# Altium footprint library NDLib.PCBLIB: 499 footprints (part 6 of 32)
Each footprint in its own frame and in the unit in brackets; x right, y up, seen from the top. Pads: shape width x height; smd on the part's side, far side on the other; paste and mask are expansions set on the pad; w line width, h text height; cw(c..) or ccw(c..) is an arc to the next point about the centre after c.
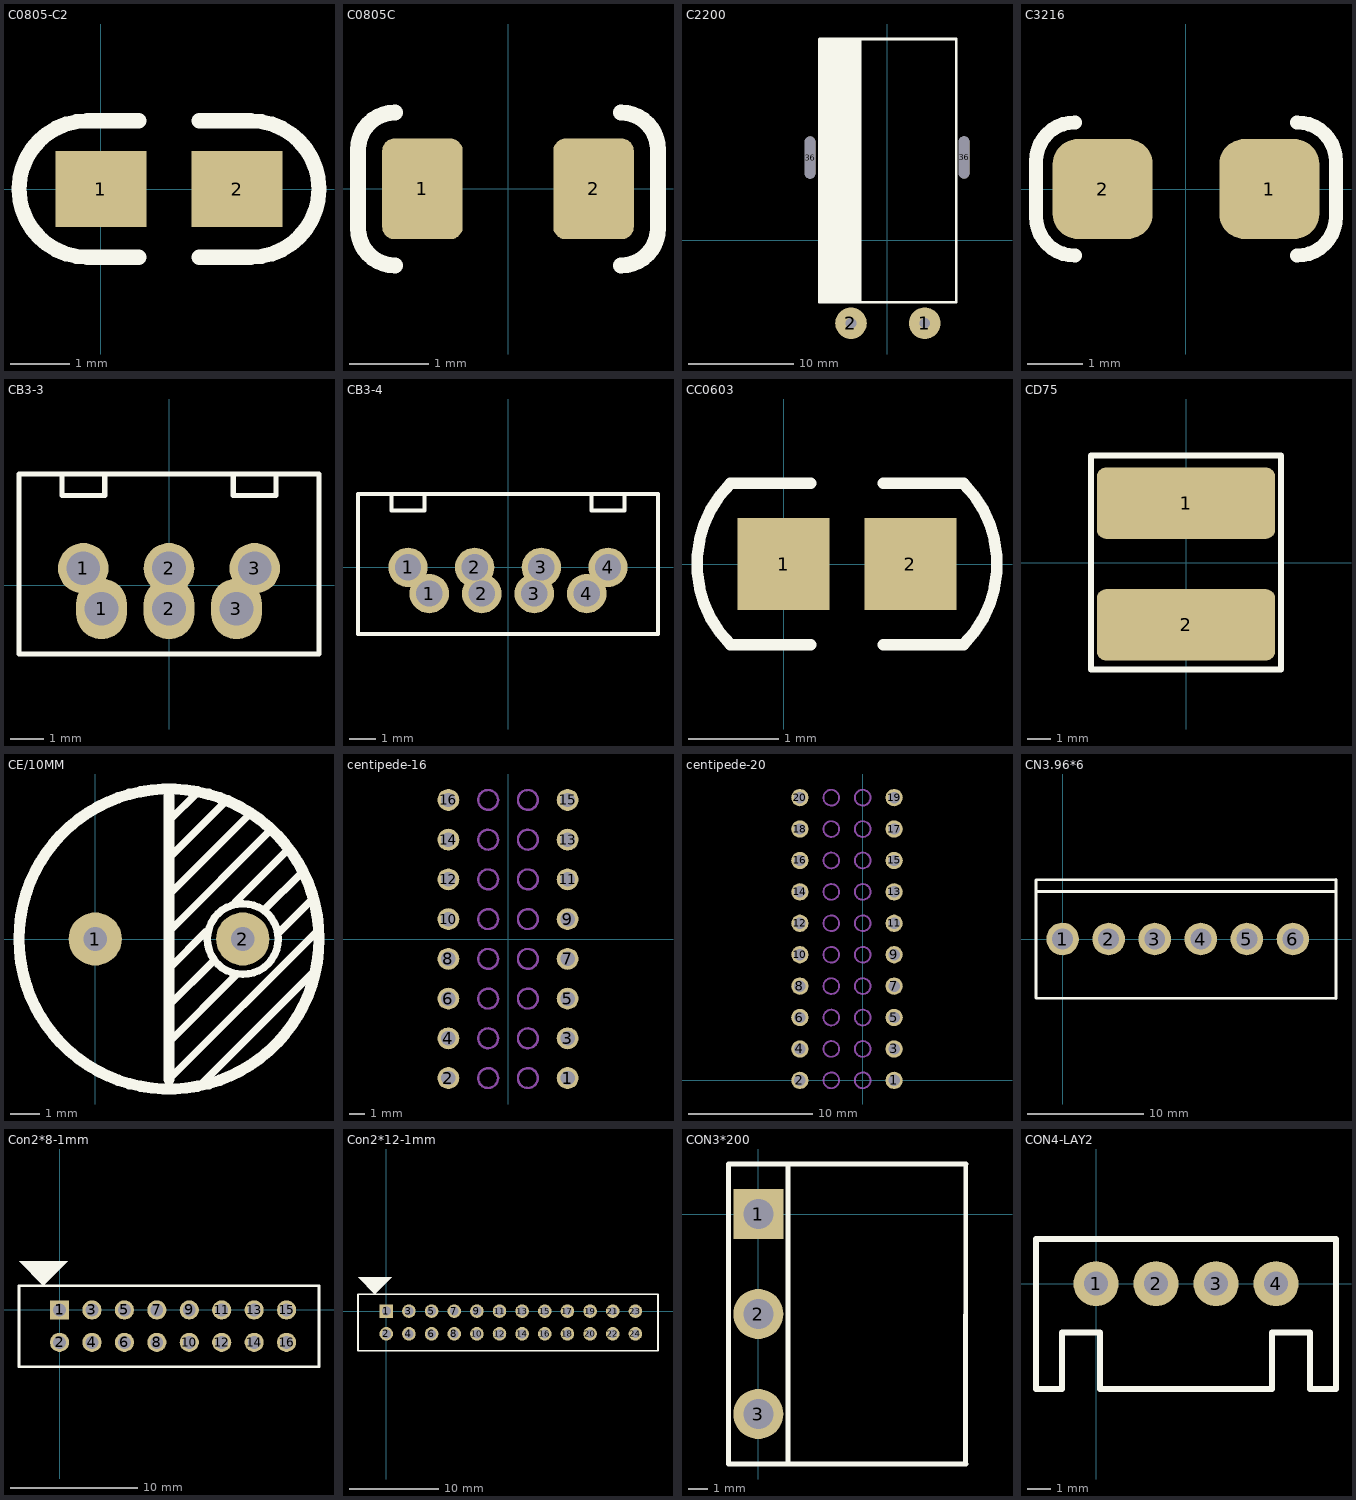
[diagram p5: the footprints below, top view; thin cyan lines are the x and y axes]

## C0805-C2 [mil]
height 78.74
pads (2):
  rect 60x50 smd: 1(0,0) 2(90,0)
TopOverlay:
  lines w10: 25,-45 -9,-45 cw(c-9,0) -9,45 25,45 ; 65,-45 99,-45 ccw(c99,0) 99,45 65,45

## C0805C [mil]
pads (2):
  rrect30% 40x50 smd: 1(-42.5,0) 2(42.5,0)
TopOverlay:
  lines w8: -74.5,-19.59 ccw(c-56.09,-19.59) -56.09,-38 ; -74.5,-18.59 -74.5,18.5 ; -74.5,19.5 cw(c-56.09,19.5) -56.09,37.91 ; 56.09,-38 ccw(c56.09,-19.59) 74.5,-19.59 ; 56.09,37.91 cw(c56.09,19.5) 74.5,19.5 ; 74.5,-18.59 74.5,18.5
3D body: height 30.39, standoff -0.39, extent -39.35,-24.61 39.39,24.61

## C2200 [mm]
height 10
pads (4):
  round 3 hole 1: 1(3.575,-7.875) 2(-3.425,-7.875)
  oval 1x4 hole 1 slot 4 at 90 deg: 36(-7.315,7.863) 36(7.315,7.875)
TopOverlay:
  region: -2.425,-5.877 -2.425,19.123 -6.425,19.123 -6.425,-5.877
  lines w0.254: -6.425,-5.875 -6.425,19.125 6.575,19.125 6.575,-5.875 -6.425,-5.875

## C3216 [mm]
pads (2):
  rrect50% 1.8x1.8 smd: 1(1.5,0) 2(-1.5,0)
TopOverlay:
  lines w0.254: -2,-1.2 cw(c-2,-0.5) -2.7,-0.5 -2.7,0.5 cw(c-2,0.5) -2,1.2 ; 2,-1.2 ccw(c2,-0.5) 2.7,-0.5 2.7,0.5 ccw(c2,0.5) 2,1.2

## CB3-3 [mm]
pads (6):
  round 1.5 hole 1: 1(-2.54,0.5) 2(0,0.5) 3(2.54,0.5)
  oval 1.5x1.8 hole 1: 1(-2,-0.7) 2(0,-0.7) 3(2,-0.7)
TopOverlay:
  lines w0.152: -3.175,3.294 -3.175,2.659 -1.905,2.659 -1.905,3.294 ; 1.905,3.294 1.905,2.659 3.175,2.659 3.175,3.294 ; -4.445,-2.04 4.445,-2.04 4.445,3.294 -4.445,3.294 -4.445,-2.04

## CB3-4 [mm]
pads (8):
  round 1.5 hole 1: 1(-3.81,0) 1(-3,-1) 2(-1.27,0) 2(-1,-1) 3(1,-1) 3(1.27,0) 4(3,-1) 4(3.81,0)
TopOverlay:
  lines w0.152: -4.445,2.794 -4.445,2.159 -3.175,2.159 -3.175,2.794 ; 3.175,2.794 3.175,2.159 4.445,2.159 4.445,2.794 ; -5.715,-2.54 -5.715,2.794 5.715,2.794 5.715,-2.54 -5.715,-2.54

## CC0603 [mil]
pads (2):
  rect 40x40 smd: 1(0,0) 2(55,0)
TopOverlay:
  lines w5: 11.81,-35 -23.19,-35 cw(c11.81,0) -23.19,35 11.81,35 ; 43.19,-35 78.19,-35 ccw(c43.19,0) 78.19,35 43.19,35

## CD75 [mm]
height 4
pads (2):
  rrect25% 7.5x3 smd: 1(0,2.5) 2(0,-2.625)
TopOverlay:
  lines w0.254: -4,-4.5 -4,4.5 4,4.5 4,-4.5 -4,-4.5

## CE/10MM [mm]
pads (2):
  round 1.8 hole 0.8: 1(0,0) 2(5,0)
TopOverlay:
  circle w0.254: c5,0 r1.2
  circle w0.381: c2.5,0 r5.08
  lines w0.254: 2.5,-4.75 7.5,0.25 ; 2.5,-3.5 4.75,-1.25 ; 2.5,-2.25 4,-0.75 ; 2.5,-1 3.75,0.25 ; 2.5,0.25 6,3.75 ; 2.5,1.5 5.25,4.25 ; 2.5,4 3.5,5 ; 2.625,2.875 4.5,4.75 ; 3.5,-5 7.5,-1 ; 4.75,1.25 6.5,3 ; 5.75,1 7,2.25 ; 6.25,0.25 7.25,1.25 ; 7.371,-1.589 7.4,-1.425
  lines w0.381: 2.5,-4.75 2.5,4.826
3D body: height 16.53, standoff -3.74, extent -2.551,-5 7.5,5.051

## centipede-16 [mil]
height 196.85
pads (16):
  round 55 hole 36: 1(150,-350) 2(-150,-350) 3(150,-250) 4(-150,-250) 5(150,-150) 6(-150,-150) 7(150,-50) 8(-150,-50) 9(150,50) 10(-150,50) 11(150,150) 12(-150,150) 13(150,250) 14(-150,250) 15(150,350) 16(-150,350)
Mechanical1:
  circle w6: c50,150 r25
  circle w6: c-50,150 r25
  circle w6: c-50,250 r25
  circle w6: c50,250 r25
  circle w6: c-50,350 r25
  circle w6: c50,350 r25
  circle w6: c50,50 r25
  circle w6: c-50,50 r25
  circle w6: c50,-50 r25
  circle w6: c-50,-50 r25
  circle w6: c50,-150 r25
  circle w6: c-50,-150 r25
  circle w6: c50,-250 r25
  circle w6: c-50,-250 r25
  circle w6: c-50,-350 r25
  circle w6: c50,-350 r25

## centipede-20 [mil]
height 196.85
pads (20):
  round 55 hole 36: 1(100,0) 2(-200,0) 3(100,100) 4(-200,100) 5(100,200) 6(-200,200) 7(100,300) 8(-200,300) 9(100,400) 10(-200,400) 11(100,500) 12(-200,500) 13(100,600) 14(-200,600) 15(100,700) 16(-200,700) 17(100,800) 18(-200,800) 19(100,900) 20(-200,900)
Mechanical1:
  circle w6: c0,500 r25
  circle w6: c-100,500 r25
  circle w6: c-100,600 r25
  circle w6: c0,600 r25
  circle w6: c-100,700 r25
  circle w6: c0,700 r25
  circle w6: c-100,800 r25
  circle w6: c0,800 r25
  circle w6: c-100,900 r25
  circle w6: c0,900 r25
  circle w6: c0,400 r25
  circle w6: c-100,400 r25
  circle w6: c0,300 r25
  circle w6: c-100,300 r25
  circle w6: c0,200 r25
  circle w6: c-100,200 r25
  circle w6: c0,100 r25
  circle w6: c-100,100 r25
  circle w6: c-100,0 r25
  circle w6: c0,0 r25

## CN3.96*6 [mm]
pads (6):
  round 2.8 hole 1.8: 1(0,0) 2(3.96,0) 3(7.92,0) 4(11.88,0) 5(15.84,0) 6(19.8,0)
TopOverlay:
  lines w0.254: -2.286,4.064 23.5,4.1 ; 23.5,-5.1 -2.286,-5.08 -2.286,5.08 23.5,5.1 23.5,-5.06

## Con2*8-1mm [mm]
height 2.54
pads (16):
  rect 1.5x1.5 hole 1: 1(0,0)
  round 1.5 hole 1: 2(0,-2.54) 3(2.54,0) 4(2.54,-2.54) 5(5.08,0) 6(5.08,-2.54) 7(7.62,0) 8(7.62,-2.54) 9(10.16,0) 10(10.16,-2.54) 11(12.7,0) 12(12.7,-2.54) 13(15.24,0) 14(15.24,-2.54) 15(17.78,0) 16(17.78,-2.54)
TopOverlay:
  region: 0.635,3.81 -1.27,1.905 -3.175,3.81
  lines w0.2: -3.175,-4.445 20.32,-4.445 20.32,1.905 -3.175,1.905 -3.175,-4.445

## Con2*12-1mm [mil]
height 196.85
pads (24):
  rect 60x60 hole 39.37: 1(0,0)
  round 60 hole 39.37: 2(0,-100) 3(100,0) 4(100,-100) 5(200,0) 6(200,-100) 7(300,0) 8(300,-100) 9(400,0) 10(400,-100) 11(500,0) 12(500,-100) 13(600,0) 14(600,-100) 15(700,0) 16(700,-100)
  round 60 hole 36: 17(800,0) 18(800,-100) 19(900,0) 20(900,-100) 21(1000,0) 22(1000,-100) 23(1100,0) 24(1100,-100)
TopOverlay:
  region: 25,150 -50,75 -125,150
  lines w7.87: -125,-175 1200,-175 1200,75 -125,75 -125,-175

## CON3*200 [mil]
pads (3):
  rect 100x100 hole 60: 1(0,0)
  round 100 hole 60: 2(0,-200) 3(0,-400)
TopOverlay:
  lines w10: 59.99,-500 59.99,100 ; 414.68,-500 415,100 -60,100 -60,-500 415,-500

## CON4-LAY2 [mil]
pads (4):
  round 75 hole 40: 1(0,0) 2(100,0) 3(200,0) 4(300,0)
TopOverlay:
  lines w10: -100,-160 -100,74.8 400,74.8 400,-160 ; -100,-120.79 -100,-175.91 -56.69,-175.91 -56.69,-115.28 ; -56.69,-114.49 -56.69,-81.42 6.3,-81.42 6.3,-114.49 6.3,-175.91 293.7,-175.91 293.7,-114.49 293.7,-81.42 356.69,-81.42 356.69,-114.49 ; 356.69,-115.28 356.69,-175.91 400,-175.91 400,-120.79